# Altium integrated library LEMO Unipole And Multipole Type Connectors.IntLib: 1566 symbols (part 10 of 13)
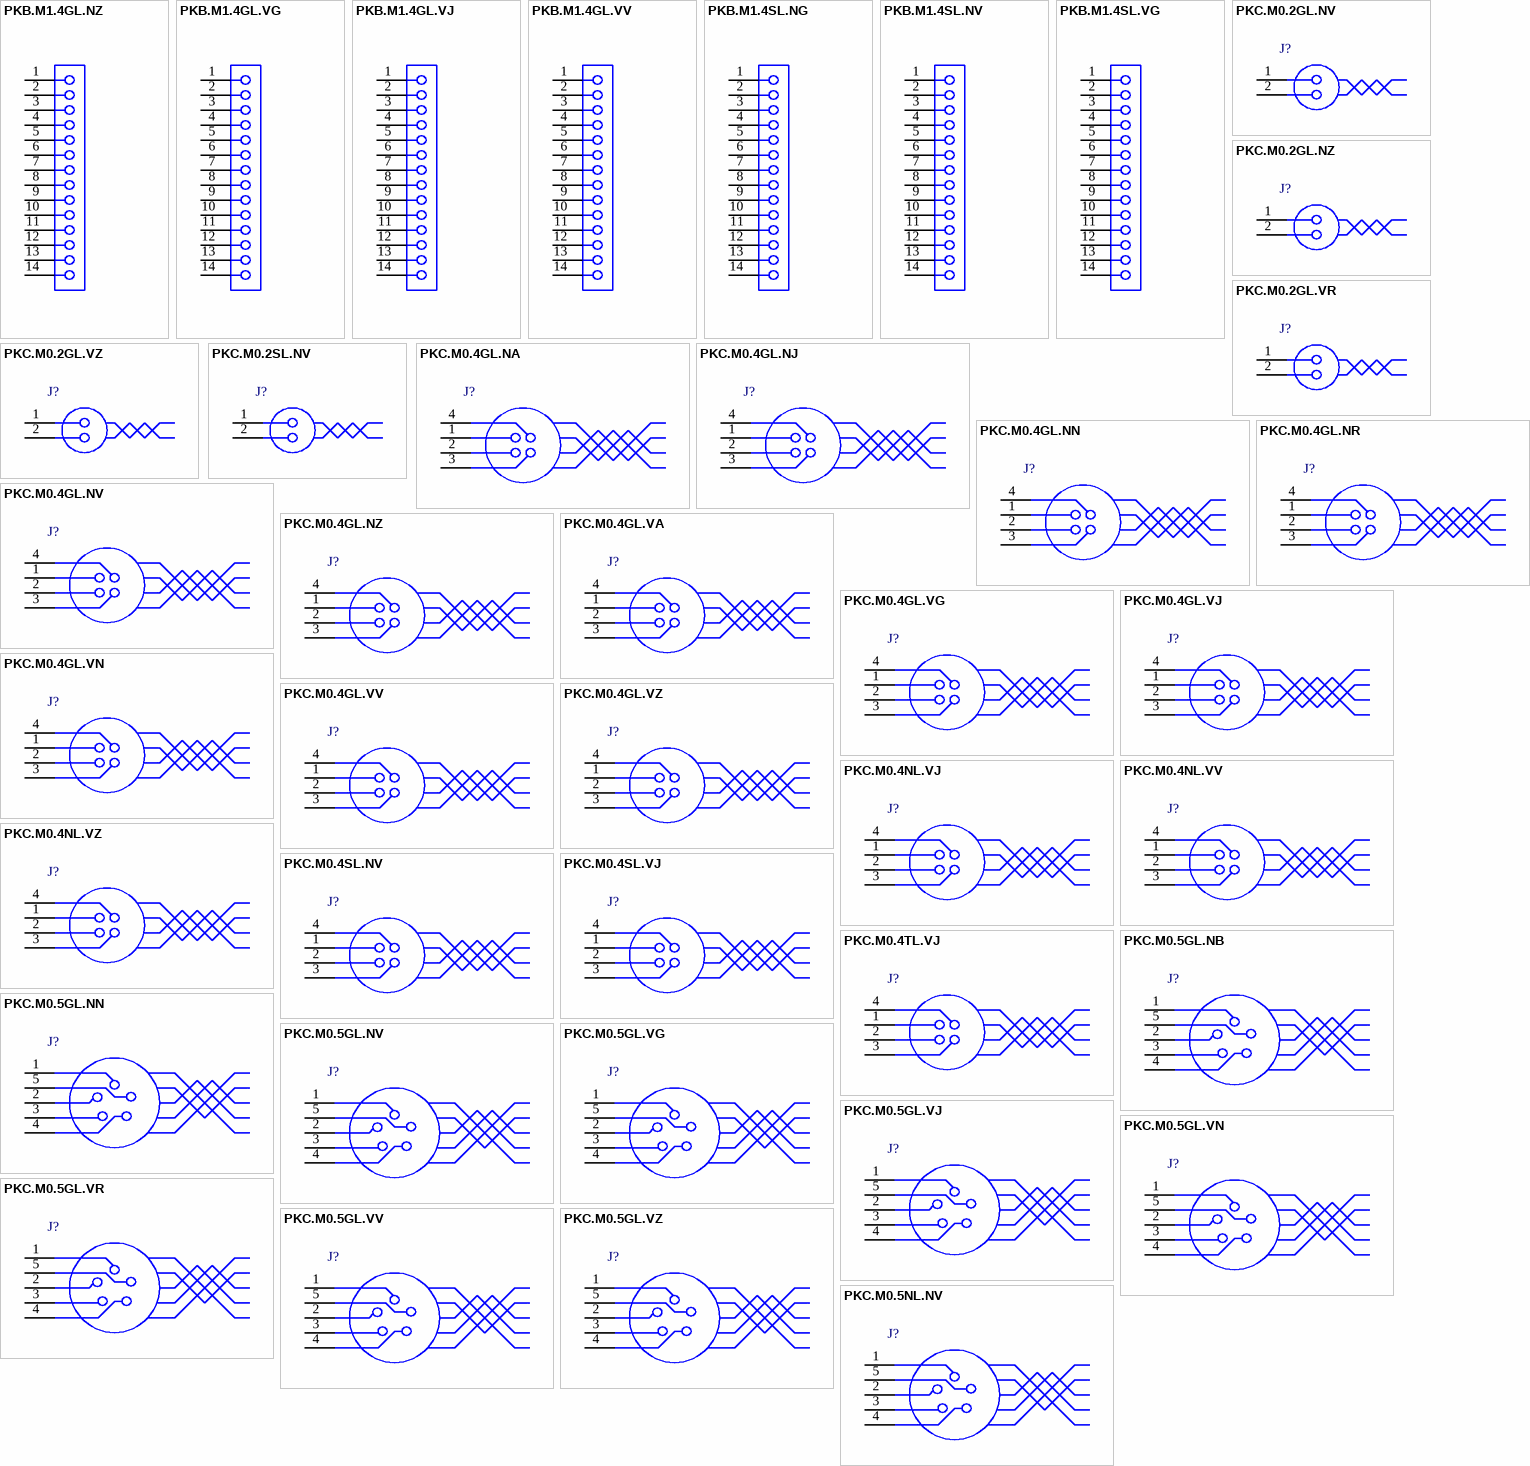
[diagram p52: symbols PKB.M1.4GL.NZ to PKC.M0.5NL.NV]

## PKC.M0.4SL.VJ
designator J?
Fixed receptacle with two nuts (back panel mounting), 90° print contacts, Key (C), P series, Multipole Type with 4 Contacts; Manufacturer: LEMO; PartNumber: PKC.M0.4SL.VJ; Number of contacts: 4; Contact Diameter: 0.9 mm; Test voltage (kV rms) Contact-Contact: 1.2; Rated Current(A): 8; DatasheetVersion: Jun-14; PackageReference: PKC.M0.4SL.VJ; PackageDescription: Fixed receptacle with two nuts (back panel mounting), 90° print contacts, Key(C) for Printed Circuit; Supplier 1: Mouser; Supplier Part Number 1: 736-PKCM04SLVJ; Supplier 2: Digi-Key; Supplier Part Number 2: PKC.M0.4SL.VJ-ND; ComponentLink1Description: Manufacturer URL; ComponentLink1URL: http://www.lemo.com; ComponentLink2Description: Datasheet; ComponentLink2URL: http://intra.lemo.ch/catalog/ROW/UK_English/P_series_catalog.pdf
footprint PKC.M0.4SL.VJ (Socket, Female, Height 33.5 mm, Through hole)
pins: 1, 2, 3, 4

## PKC.M0.4TL.VJ
designator J?
Fixed receptacle with two nuts (back panel mounting), 90° print contacts, Key (C), P series, Multipole Type with 4 Contacts; Manufacturer: LEMO; PartNumber: PKC.M0.4TL.VJ; Number of contacts: 4; Contact Diameter: 0.9 mm; Test voltage (kV rms) Contact-Contact: 1.2; Rated Current(A): 8; DatasheetVersion: Jun-14; PackageReference: PKC.M0.4TL.VJ; PackageDescription: Fixed receptacle with two nuts (back panel mounting), 90° print contacts, Key(C) for Printed Circuit; Supplier 1: Mouser; Supplier Part Number 1: 736-PKCM04TLVJ; Supplier 2: Digi-Key; Supplier Part Number 2: PKC.M0.4TL.VJ-ND; ComponentLink1Description: Manufacturer URL; ComponentLink1URL: http://www.lemo.com; ComponentLink2Description: Datasheet; ComponentLink2URL: http://intra.lemo.ch/catalog/ROW/UK_English/P_series_catalog.pdf
footprint PKC.M0.4TL.VJ (Socket, Female, Height 33.5 mm, Through hole)
pins: 1, 2, 3, 4

## PKC.M0.5GL.NB
designator J?
Fixed receptacle with two nuts (back panel mounting), straight print contacts, Key (C), P series, Multipole Type with 5 Contacts; Manufacturer: LEMO; PartNumber: PKC.M0.5GL.NB; Number of contacts: 5; Contact Diameter: 0.9 mm; Test voltage (kV rms) Contact-Contact: 1.05; Rated Current(A): 7; DatasheetVersion: Jun-14; PackageReference: PKC.M0.5GL.NB; PackageDescription: Fixed receptacle with two nuts (back panel mounting), straight print contacts, Key(C) for Printed Circuit; ComponentLink1Description: Manufacturer URL; ComponentLink1URL: http://www.lemo.com; ComponentLink2Description: Datasheet; ComponentLink2URL: http://intra.lemo.ch/catalog/ROW/UK_English/P_series_catalog.pdf
footprint PKC.M0.5GL.NB (Socket, Female, Height 33.5 mm, Through hole)
pins: 1, 2, 3, 4, 5

## PKC.M0.5GL.NN
designator J?
Fixed receptacle with two nuts (back panel mounting), straight print contacts, Key (C), P series, Multipole Type with 5 Contacts; Manufacturer: LEMO; PartNumber: PKC.M0.5GL.NN; Number of contacts: 5; Contact Diameter: 0.9 mm; Test voltage (kV rms) Contact-Contact: 1.05; Rated Current(A): 7; DatasheetVersion: Jun-14; PackageReference: PKC.M0.5GL.NN; PackageDescription: Fixed receptacle with two nuts (back panel mounting), straight print contacts, Key(C) for Printed Circuit; ComponentLink1Description: Manufacturer URL; ComponentLink1URL: http://www.lemo.com; ComponentLink2Description: Datasheet; ComponentLink2URL: http://intra.lemo.ch/catalog/ROW/UK_English/P_series_catalog.pdf
footprint PKC.M0.5GL.NN (Socket, Female, Height 33.5 mm, Through hole)
pins: 1, 2, 3, 4, 5

## PKC.M0.5GL.NV
designator J?
Fixed receptacle with two nuts (back panel mounting), straight print contacts, Key (C), P series, Multipole Type with 5 Contacts; Manufacturer: LEMO; PartNumber: PKC.M0.5GL.NV; Number of contacts: 5; Contact Diameter: 0.9 mm; Test voltage (kV rms) Contact-Contact: 1.05; Rated Current(A): 7; DatasheetVersion: Jun-14; PackageReference: PKC.M0.5GL.NV; PackageDescription: Fixed receptacle with two nuts (back panel mounting), straight print contacts, Key(C) for Printed Circuit; ComponentLink1Description: Manufacturer URL; ComponentLink1URL: http://www.lemo.com; ComponentLink2Description: Datasheet; ComponentLink2URL: http://intra.lemo.ch/catalog/ROW/UK_English/P_series_catalog.pdf
footprint PKC.M0.5GL.NV (Socket, Female, Height 33.5 mm, Through hole)
pins: 1, 2, 3, 4, 5

## PKC.M0.5GL.VG
designator J?
Fixed receptacle with two nuts (back panel mounting), 90° print contacts, Key (C), P series, Multipole Type with 5 Contacts; Manufacturer: LEMO; PartNumber: PKC.M0.5GL.VG; Number of contacts: 5; Contact Diameter: 0.9 mm; Test voltage (kV rms) Contact-Contact: 1.05; Rated Current(A): 7; DatasheetVersion: Jun-14; PackageReference: PKC.M0.5GL.VG; PackageDescription: Fixed receptacle with two nuts (back panel mounting), 90° print contacts, Key(C) for Printed Circuit; ComponentLink1Description: Manufacturer URL; ComponentLink1URL: http://www.lemo.com; ComponentLink2Description: Datasheet; ComponentLink2URL: http://intra.lemo.ch/catalog/ROW/UK_English/P_series_catalog.pdf
footprint PKC.M0.5GL.VG (Socket, Female, Height 33.5 mm, Through hole)
pins: 1, 2, 3, 4, 5

## PKC.M0.5GL.VJ
designator J?
Fixed receptacle with two nuts (back panel mounting), 90° print contacts, Key (C), P series, Multipole Type with 5 Contacts; Manufacturer: LEMO; PartNumber: PKC.M0.5GL.VJ; Number of contacts: 5; Contact Diameter: 0.9 mm; Test voltage (kV rms) Contact-Contact: 1.05; Rated Current(A): 7; DatasheetVersion: Jun-14; PackageReference: PKC.M0.5GL.VJ; PackageDescription: Fixed receptacle with two nuts (back panel mounting), 90° print contacts, Key(C) for Printed Circuit; ComponentLink1Description: Manufacturer URL; ComponentLink1URL: http://www.lemo.com; ComponentLink2Description: Datasheet; ComponentLink2URL: http://intra.lemo.ch/catalog/ROW/UK_English/P_series_catalog.pdf
footprint PKC.M0.5GL.VJ (Socket, Female, Height 33.5 mm, Through hole)
pins: 1, 2, 3, 4, 5

## PKC.M0.5GL.VN
designator J?
Fixed receptacle with two nuts (back panel mounting), 90° print contacts, Key (C), P series, Multipole Type with 5 Contacts; Manufacturer: LEMO; PartNumber: PKC.M0.5GL.VN; Number of contacts: 5; Contact Diameter: 0.9 mm; Test voltage (kV rms) Contact-Contact: 1.05; Rated Current(A): 7; DatasheetVersion: Jun-14; PackageReference: PKC.M0.5GL.VN; PackageDescription: Fixed receptacle with two nuts (back panel mounting), 90° print contacts, Key(C) for Printed Circuit; ComponentLink1Description: Manufacturer URL; ComponentLink1URL: http://www.lemo.com; ComponentLink2Description: Datasheet; ComponentLink2URL: http://intra.lemo.ch/catalog/ROW/UK_English/P_series_catalog.pdf
footprint PKC.M0.5GL.VN (Socket, Female, Height 33.5 mm, Through hole)
pins: 1, 2, 3, 4, 5

## PKC.M0.5GL.VR
designator J?
Fixed receptacle with two nuts (back panel mounting), 90° print contacts, Key (C),  series, Multipole Type with 5 Contacts; Manufacturer: LEMO; PartNumber: PKC.M0.5GL.VR; Number of contacts: 5; Contact Diameter: 0.9 mm; Test voltage (kV rms) Contact-Contact: 1.05; Rated Current(A): 7; DatasheetVersion: Jun-14; PackageReference: PKC.M0.5GL.VR; PackageDescription: Fixed receptacle with two nuts (back panel mounting), 90° print contacts, Key(C) for Printed Circuit; ComponentLink1Description: Manufacturer URL; ComponentLink1URL: http://www.lemo.com; ComponentLink2Description: Datasheet; ComponentLink2URL: http://intra.lemo.ch/catalog/ROW/UK_English/P_series_catalog.pdf
footprint PKC.M0.5GL.VR (Socket, Female, Height 33.5 mm, Through hole)
pins: 1, 2, 3, 4, 5

## PKC.M0.5GL.VV
designator J?
Fixed receptacle with two nuts (back panel mounting), 90° print contacts, Key (C), P series, Multipole Type with 5 Contacts; Manufacturer: LEMO; PartNumber: PKC.M0.5GL.VV; Number of contacts: 5; Contact Diameter: 0.9 mm; Test voltage (kV rms) Contact-Contact: 1.05; Rated Current(A): 7; DatasheetVersion: Jun-14; PackageReference: PKC.M0.5GL.VV; PackageDescription: Fixed receptacle with two nuts (back panel mounting), 90° print contacts, Key(C) for Printed Circuit; ComponentLink1Description: Manufacturer URL; ComponentLink1URL: http://www.lemo.com; ComponentLink2Description: Datasheet; ComponentLink2URL: http://intra.lemo.ch/catalog/ROW/UK_English/P_series_catalog.pdf
footprint PKC.M0.5GL.VV (Socket, Female, Height 33.5 mm, Through hole)
pins: 1, 2, 3, 4, 5

## PKC.M0.5GL.VZ
designator J?
Fixed receptacle with 1 nut (without 2nd front nut), Key (C), P series, Multipole Type with 5 Contacts; Manufacturer: LEMO; PartNumber: PKC.M0.5GL.VZ; Number of contacts: 5; Contact Diameter: 0.9 mm; Test voltage (kV rms) Contact-Contact: 1.05; Rated Current(A): 7; DatasheetVersion: Jun-14; PackageReference: PKC.M0.5GL.VZ; PackageDescription: Fixed receptacle with 1 nut (without 2nd front nut), Key(C) for Printed Circuit; ComponentLink1Description: Manufacturer URL; ComponentLink1URL: http://www.lemo.com; ComponentLink2Description: Datasheet; ComponentLink2URL: http://intra.lemo.ch/catalog/ROW/UK_English/P_series_catalog.pdf
footprint PKC.M0.5GL.VZ (Socket, Female, Height 33.5 mm, Through hole)
pins: 1, 2, 3, 4, 5

## PKC.M0.5NL.NV
designator J?
Fixed receptacle with two nuts (back panel mounting), straight print contacts, Key (C), P series, Multipole Type with 5 Contacts; Manufacturer: LEMO; PartNumber: PKC.M0.5NL.NV; Number of contacts: 5; Contact Diameter: 0.9 mm; Test voltage (kV rms) Contact-Contact: 1.05; Rated Current(A): 7; DatasheetVersion: Jun-14; PackageReference: PKC.M0.5NL.NV; PackageDescription: Fixed receptacle with two nuts (back panel mounting), straight print contacts, Key(C) for Printed Circuit; ComponentLink1Description: Manufacturer URL; ComponentLink1URL: http://www.lemo.com; ComponentLink2Description: Datasheet; ComponentLink2URL: http://intra.lemo.ch/catalog/ROW/UK_English/P_series_catalog.pdf
footprint PKC.M0.5NL.NV (Socket, Female, Height 33.5 mm, Through hole)
pins: 1, 2, 3, 4, 5

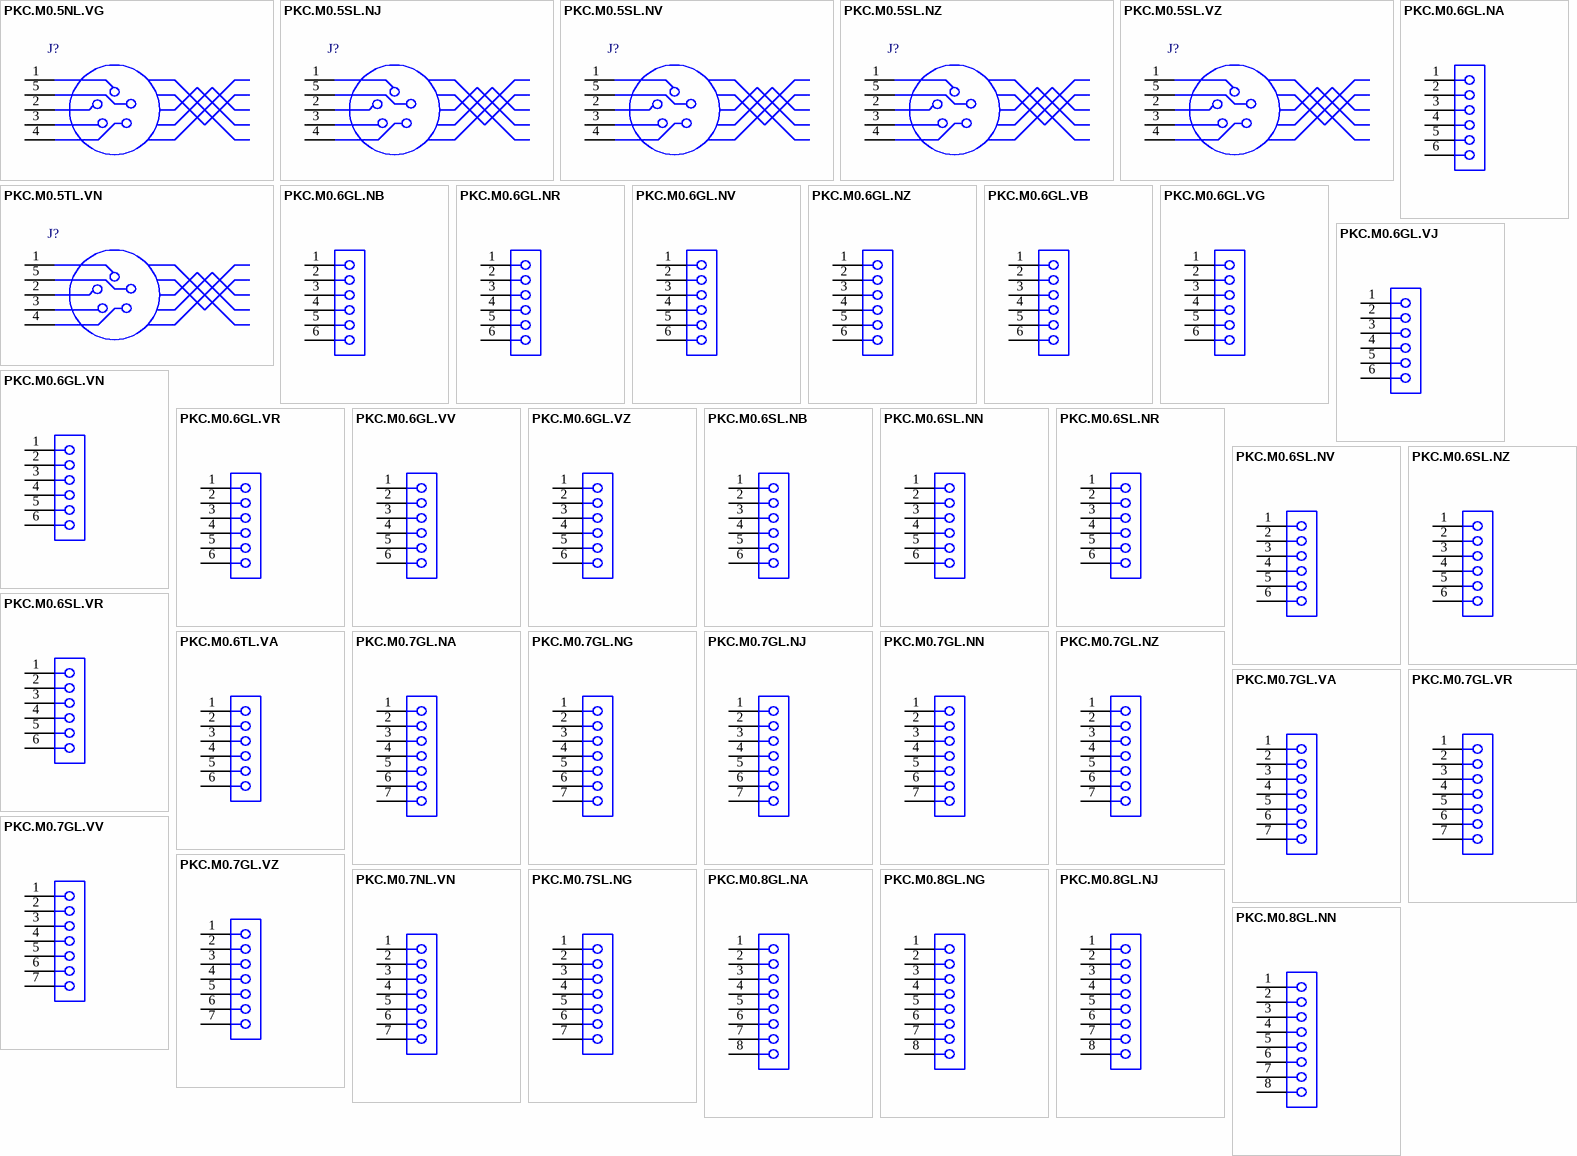
[diagram p31: symbols PKC.M0.5NL.VG to PKC.M0.8GL.NN]

## PKC.M0.5NL.VG
designator J?
Fixed receptacle with two nuts (back panel mounting), 90° print contacts, Key (C), P series, Multipole Type with 5 Contacts; Manufacturer: LEMO; PartNumber: PKC.M0.5NL.VG; Number of contacts: 5; Contact Diameter: 0.9 mm; Test voltage (kV rms) Contact-Contact: 1.05; Rated Current(A): 7; DatasheetVersion: Jun-14; PackageReference: PKC.M0.5NL.VG; PackageDescription: Fixed receptacle with two nuts (back panel mounting), 90° print contacts, Key(C) for Printed Circuit; ComponentLink1Description: Manufacturer URL; ComponentLink1URL: http://www.lemo.com; ComponentLink2Description: Datasheet; ComponentLink2URL: http://intra.lemo.ch/catalog/ROW/UK_English/P_series_catalog.pdf
footprint PKC.M0.5NL.VG (Socket, Female, Height 33.5 mm, Through hole)
pins: 1, 2, 3, 4, 5

## PKC.M0.5SL.NJ
designator J?
Fixed receptacle with two nuts (back panel mounting), straight print contacts, Key (C),  series, Multipole Type with 5 Contacts; Manufacturer: LEMO; PartNumber: PKC.M0.5SL.NJ; Number of contacts: 5; Contact Diameter: 0.9 mm; Test voltage (kV rms) Contact-Contact: 1.05; Rated Current(A): 7; DatasheetVersion: Jun-14; PackageReference: PKC.M0.5SL.NJ; PackageDescription: Fixed receptacle with two nuts (back panel mounting), straight print contacts, Key(C) for Printed Circuit; Supplier 1: Mouser; Supplier Part Number 1: 736-PKCM05SLNJ; Supplier 2: Digi-Key; Supplier Part Number 2: PKC.M0.5SL.NJ-ND; ComponentLink1Description: Manufacturer URL; ComponentLink1URL: http://www.lemo.com; ComponentLink2Description: Datasheet; ComponentLink2URL: http://intra.lemo.ch/catalog/ROW/UK_English/P_series_catalog.pdf
footprint PKC.M0.5SL.NJ (Socket, Female, Height 33.5 mm, Through hole)
pins: 1, 2, 3, 4, 5

## PKC.M0.5SL.NV
designator J?
Fixed receptacle with two nuts (back panel mounting), straight print contacts, Key (C), P series, Multipole Type with 5 Contacts; Manufacturer: LEMO; PartNumber: PKC.M0.5SL.NV; Number of contacts: 5; Contact Diameter: 0.9 mm; Test voltage (kV rms) Contact-Contact: 1.05; Rated Current(A): 7; DatasheetVersion: Jun-14; PackageReference: PKC.M0.5SL.NV; PackageDescription: Fixed receptacle with two nuts (back panel mounting), straight print contacts, Key(C) for Printed Circuit; ComponentLink1Description: Manufacturer URL; ComponentLink1URL: http://www.lemo.com; ComponentLink2Description: Datasheet; ComponentLink2URL: http://intra.lemo.ch/catalog/ROW/UK_English/P_series_catalog.pdf
footprint PKC.M0.5SL.NV (Socket, Female, Height 33.5 mm, Through hole)
pins: 1, 2, 3, 4, 5

## PKC.M0.5SL.NZ
designator J?
Fixed receptacle with 1 nut (without 2nd front nut), Key (C), P series, Multipole Type with 5 Contacts; Manufacturer: LEMO; PartNumber: PKC.M0.5SL.NZ; Number of contacts: 5; Contact Diameter: 0.9 mm; Test voltage (kV rms) Contact-Contact: 1.05; Rated Current(A): 7; DatasheetVersion: Jun-14; PackageReference: PKC.M0.5SL.NZ; PackageDescription: Fixed receptacle with 1 nut (without 2nd front nut), Key(C) for Printed Circuit; Supplier 1: Mouser; Supplier Part Number 1: 736-PKCM05SLNZ; Supplier 2: Digi-Key; Supplier Part Number 2: PKC.M0.5SL.NZ-ND; ComponentLink1Description: Manufacturer URL; ComponentLink1URL: http://www.lemo.com; ComponentLink2Description: Datasheet; ComponentLink2URL: http://intra.lemo.ch/catalog/ROW/UK_English/P_series_catalog.pdf
footprint PKC.M0.5SL.NZ (Socket, Female, Height 25 mm, Through hole)
pins: 1, 2, 3, 4, 5

## PKC.M0.5SL.VZ
designator J?
Fixed receptacle with 1 nut (without 2nd front nut), Key (C), P series, Multipole Type with 5 Contacts; Manufacturer: LEMO; PartNumber: PKC.M0.5SL.VZ; Number of contacts: 5; Contact Diameter: 0.9 mm; Test voltage (kV rms) Contact-Contact: 1.05; Rated Current(A): 7; DatasheetVersion: Jun-14; PackageReference: PKC.M0.5SL.VZ; PackageDescription: Fixed receptacle with 1 nut (without 2nd front nut), Key(C) for Printed Circuit; Supplier 1: Mouser; Supplier Part Number 1: 736-PKCM05SLVZ; Supplier 2: Digi-Key; Supplier Part Number 2: PKC.M0.5SL.VZ-ND; ComponentLink1Description: Manufacturer URL; ComponentLink1URL: http://www.lemo.com; ComponentLink2Description: Datasheet; ComponentLink2URL: http://intra.lemo.ch/catalog/ROW/UK_English/P_series_catalog.pdf
footprint PKC.M0.5SL.VZ (Socket, Female, Height 33.5 mm, Through hole)
pins: 1, 2, 3, 4, 5

## PKC.M0.5TL.VN
designator J?
Fixed receptacle with two nuts (back panel mounting), 90° print contacts, Key (C), P series, Multipole Type with 5 Contacts; Manufacturer: LEMO; PartNumber: PKC.M0.5TL.VN; Number of contacts: 5; Contact Diameter: 0.9 mm; Test voltage (kV rms) Contact-Contact: 1.05; Rated Current(A): 7; DatasheetVersion: Jun-14; PackageReference: PKC.M0.5TL.VN; PackageDescription: Fixed receptacle with two nuts (back panel mounting), 90° print contacts, Key(C) for Printed Circuit; Supplier 1: Mouser; Supplier Part Number 1: 736-PKCM05TLVN; Supplier 2: Digi-Key; Supplier Part Number 2: PKC.M0.5TL.VN-ND; ComponentLink1Description: Manufacturer URL; ComponentLink1URL: http://www.lemo.com; ComponentLink2Description: Datasheet; ComponentLink2URL: http://intra.lemo.ch/catalog/ROW/UK_English/P_series_catalog.pdf
footprint PKC.M0.5TL.VN (Socket, Female, Height 33.5 mm, Through hole)
pins: 1, 2, 3, 4, 5

## PKC.M0.6GL.NA
designator J?
Fixed receptacle with two nuts (back panel mounting), straight print contacts, Key (C), P series, Multipole Type with 6 Contacts; Manufacturer: LEMO; PartNumber: PKC.M0.6GL.NA; Number of contacts: 6; Contact Diameter: 0.7 mm; Test voltage (kV rms) Contact-Contact: 1.05; DatasheetVersion: Jun-14; PackageReference: PKC.M0.6GL.NA; PackageDescription: Fixed receptacle with two nuts (back panel mounting), straight print contacts, Key(C) for Printed Circuit; Rated Current(A): 6; ComponentLink1Description: Manufacturer URL; ComponentLink1URL: http://www.lemo.com; ComponentLink2Description: Datasheet; ComponentLink2URL: http://intra.lemo.ch/catalog/ROW/UK_English/P_series_catalog.pdf
footprint PKC.M0.6GL.NA (Socket, Female, Height 33.5 mm, Through hole)
pins: 1, 2, 3, 4, 5, 6

## PKC.M0.6GL.NB
designator J?
Fixed receptacle with two nuts (back panel mounting), straight print contacts, Key (C), P series, Multipole Type with 6 Contacts; Manufacturer: LEMO; PartNumber: PKC.M0.6GL.NB; Number of contacts: 6; Contact Diameter: 0.7 mm; Test voltage (kV rms) Contact-Contact: 1.05; DatasheetVersion: Jun-14; PackageReference: PKC.M0.6GL.NB; PackageDescription: Fixed receptacle with two nuts (back panel mounting), straight print contacts, Key(C) for Printed Circuit; Rated Current(A): 6; ComponentLink1Description: Manufacturer URL; ComponentLink1URL: http://www.lemo.com; ComponentLink2Description: Datasheet; ComponentLink2URL: http://intra.lemo.ch/catalog/ROW/UK_English/P_series_catalog.pdf
footprint PKC.M0.6GL.NB (Socket, Female, Height 33.5 mm, Through hole)
pins: 1, 2, 3, 4, 5, 6

## PKC.M0.6GL.NR
designator J?
Fixed receptacle with two nuts (back panel mounting), straight print contacts, Key (C), P series, Multipole Type with 6 Contacts; Manufacturer: LEMO; PartNumber: PKC.M0.6GL.NR; Number of contacts: 6; Contact Diameter: 0.7 mm; Test voltage (kV rms) Contact-Contact: 1.05; DatasheetVersion: Jun-14; PackageReference: PKC.M0.6GL.NR; PackageDescription: Fixed receptacle with two nuts (back panel mounting), straight print contacts, Key(C) for Printed Circuit; Rated Current(A): 6; ComponentLink1Description: Manufacturer URL; ComponentLink1URL: http://www.lemo.com; ComponentLink2Description: Datasheet; ComponentLink2URL: http://intra.lemo.ch/catalog/ROW/UK_English/P_series_catalog.pdf
footprint PKC.M0.6GL.NR (Socket, Female, Height 33.5 mm, Through hole)
pins: 1, 2, 3, 4, 5, 6

## PKC.M0.6GL.NV
designator J?
Fixed receptacle with two nuts (back panel mounting), straight print contacts, Key (C), P series, Multipole Type with 6 Contacts; Manufacturer: LEMO; PartNumber: PKC.M0.6GL.NV; Number of contacts: 6; Contact Diameter: 0.7 mm; Test voltage (kV rms) Contact-Contact: 1.05; DatasheetVersion: Jun-14; PackageReference: PKC.M0.6GL.NV; PackageDescription: Fixed receptacle with two nuts (back panel mounting), straight print contacts, Key(C) for Printed Circuit; Rated Current(A): 6; ComponentLink1Description: Manufacturer URL; ComponentLink1URL: http://www.lemo.com; ComponentLink2Description: Datasheet; ComponentLink2URL: http://intra.lemo.ch/catalog/ROW/UK_English/P_series_catalog.pdf
footprint PKC.M0.6GL.NV (Socket, Female, Height 33.5 mm, Through hole)
pins: 1, 2, 3, 4, 5, 6

## PKC.M0.6GL.NZ
designator J?
Fixed receptacle with 1 nut (without 2nd front nut), Key (C), P series, Multipole Type with 6 Contacts; Manufacturer: LEMO; PartNumber: PKC.M0.6GL.NZ; Number of contacts: 6; Contact Diameter: 0.7 mm; Test voltage (kV rms) Contact-Contact: 1.05; DatasheetVersion: Jun-14; PackageReference: PKC.M0.6GL.NZ; PackageDescription: Fixed receptacle with 1 nut (without 2nd front nut), Key(C) for Printed Circuit; Rated Current(A): 6; ComponentLink1Description: Manufacturer URL; ComponentLink1URL: http://www.lemo.com; ComponentLink2Description: Datasheet; ComponentLink2URL: http://intra.lemo.ch/catalog/ROW/UK_English/P_series_catalog.pdf
footprint PKC.M0.6GL.NZ (Socket, Female, Height 25 mm, Through hole)
pins: 1, 2, 3, 4, 5, 6

## PKC.M0.6GL.VB
designator J?
Fixed receptacle with two nuts (back panel mounting), 90° print contacts, Key (C), P series, Multipole Type with 6 Contacts; Manufacturer: LEMO; PartNumber: PKC.M0.6GL.VB; Number of contacts: 6; Contact Diameter: 0.7 mm; Test voltage (kV rms) Contact-Contact: 1.05; DatasheetVersion: Jun-14; PackageReference: PKC.M0.6GL.VB; PackageDescription: Fixed receptacle with two nuts (back panel mounting), 90° print contacts, Key(C) for Printed Circuit; Rated Current(A): 6; ComponentLink1Description: Manufacturer URL; ComponentLink1URL: http://www.lemo.com; ComponentLink2Description: Datasheet; ComponentLink2URL: http://intra.lemo.ch/catalog/ROW/UK_English/P_series_catalog.pdf
footprint PKC.M0.6GL.VB (Socket, Female, Height 33.5 mm, Through hole)
pins: 1, 2, 3, 4, 5, 6

## PKC.M0.6GL.VG
designator J?
Fixed receptacle with two nuts (back panel mounting), 90° print contacts, Key (C), P series, Multipole Type with 6 Contacts; Manufacturer: LEMO; PartNumber: PKC.M0.6GL.VG; Number of contacts: 6; Contact Diameter: 0.7 mm; Test voltage (kV rms) Contact-Contact: 1.05; DatasheetVersion: Jun-14; PackageReference: PKC.M0.6GL.VG; PackageDescription: Fixed receptacle with two nuts (back panel mounting), 90° print contacts, Key(C) for Printed Circuit; Rated Current(A): 6; ComponentLink1Description: Manufacturer URL; ComponentLink1URL: http://www.lemo.com; ComponentLink2Description: Datasheet; ComponentLink2URL: http://intra.lemo.ch/catalog/ROW/UK_English/P_series_catalog.pdf
footprint PKC.M0.6GL.VG (Socket, Female, Height 33.5 mm, Through hole)
pins: 1, 2, 3, 4, 5, 6

## PKC.M0.6GL.VJ
designator J?
Fixed receptacle with two nuts (back panel mounting), 90° print contacts, Key (C), P series, Multipole Type with 6 Contacts; Manufacturer: LEMO; PartNumber: PKC.M0.6GL.VJ; Number of contacts: 6; Contact Diameter: 0.7 mm; Test voltage (kV rms) Contact-Contact: 1.05; DatasheetVersion: Jun-14; PackageReference: PKC.M0.6GL.VJ; PackageDescription: Fixed receptacle with two nuts (back panel mounting), 90° print contacts, Key(C) for Printed Circuit; Rated Current(A): 6; ComponentLink1Description: Manufacturer URL; ComponentLink1URL: http://www.lemo.com; ComponentLink2Description: Datasheet; ComponentLink2URL: http://intra.lemo.ch/catalog/ROW/UK_English/P_series_catalog.pdf
footprint PKC.M0.6GL.VJ (Socket, Female, Height 33.5 mm, Through hole)
pins: 1, 2, 3, 4, 5, 6

## PKC.M0.6GL.VN
designator J?
Fixed receptacle with two nuts (back panel mounting), 90° print contacts, Key (C), P series, Multipole Type with 6 Contacts; Manufacturer: LEMO; PartNumber: PKC.M0.6GL.VN; Number of contacts: 6; Contact Diameter: 0.7 mm; Test voltage (kV rms) Contact-Contact: 1.05; DatasheetVersion: Jun-14; PackageReference: PKC.M0.6GL.VN; PackageDescription: Fixed receptacle with two nuts (back panel mounting), 90° print contacts, Key(C) for Printed Circuit; Rated Current(A): 6; ComponentLink1Description: Manufacturer URL; ComponentLink1URL: http://www.lemo.com; ComponentLink2Description: Datasheet; ComponentLink2URL: http://intra.lemo.ch/catalog/ROW/UK_English/P_series_catalog.pdf
footprint PKC.M0.6GL.VN (Socket, Female, Height 33.5 mm, Through hole)
pins: 1, 2, 3, 4, 5, 6

## PKC.M0.6GL.VR
designator J?
Fixed receptacle with two nuts (back panel mounting), 90° print contacts, Key (C), P series, Multipole Type with 6 Contacts; Manufacturer: LEMO; PartNumber: PKC.M0.6GL.VR; Number of contacts: 6; Contact Diameter: 0.7 mm; Test voltage (kV rms) Contact-Contact: 1.05; DatasheetVersion: Jun-14; PackageReference: PKC.M0.6GL.VR; PackageDescription: Fixed receptacle with two nuts (back panel mounting), 90° print contacts, Key(C) for Printed Circuit; Rated Current(A): 6; ComponentLink1Description: Manufacturer URL; ComponentLink1URL: http://www.lemo.com; ComponentLink2Description: Datasheet; ComponentLink2URL: http://intra.lemo.ch/catalog/ROW/UK_English/P_series_catalog.pdf
footprint PKC.M0.6GL.VR (Socket, Female, Height 33.5 mm, Through hole)
pins: 1, 2, 3, 4, 5, 6

## PKC.M0.6GL.VV
designator J?
Fixed receptacle with two nuts (back panel mounting), 90° print contacts, Key (C), P series, Multipole Type with 6 Contacts; Manufacturer: LEMO; PartNumber: PKC.M0.6GL.VV; Number of contacts: 6; Contact Diameter: 0.7 mm; Test voltage (kV rms) Contact-Contact: 1.05; DatasheetVersion: Jun-14; PackageReference: PKC.M0.6GL.VV; PackageDescription: Fixed receptacle with two nuts (back panel mounting), 90° print contacts, Key(C) for Printed Circuit; Rated Current(A): 6; ComponentLink1Description: Manufacturer URL; ComponentLink1URL: http://www.lemo.com; ComponentLink2Description: Datasheet; ComponentLink2URL: http://intra.lemo.ch/catalog/ROW/UK_English/P_series_catalog.pdf
footprint PKC.M0.6GL.VV (Socket, Female, Height 33.5 mm, Through hole)
pins: 1, 2, 3, 4, 5, 6

## PKC.M0.6GL.VZ
designator J?
Fixed receptacle with 1 nut (without 2nd front nut), Key (C), P series, Multipole Type with 6 Contacts; Manufacturer: LEMO; PartNumber: PKC.M0.6GL.VZ; Number of contacts: 6; Contact Diameter: 0.7 mm; Test voltage (kV rms) Contact-Contact: 1.05; DatasheetVersion: Jun-14; PackageReference: PKC.M0.6GL.VZ; PackageDescription: Fixed receptacle with 1 nut (without 2nd front nut), Key(C) for Printed Circuit; Rated Current(A): 6; ComponentLink1Description: Manufacturer URL; ComponentLink1URL: http://www.lemo.com; ComponentLink2Description: Datasheet; ComponentLink2URL: http://intra.lemo.ch/catalog/ROW/UK_English/P_series_catalog.pdf
footprint PKC.M0.6GL.VZ (Socket, Female, Height 33.5 mm, Through hole)
pins: 1, 2, 3, 4, 5, 6

## PKC.M0.6SL.NB
designator J?
Fixed receptacle with two nuts (back panel mounting), straight print contacts, Key (C), P series, Multipole Type with 6 Contacts; Manufacturer: LEMO; PartNumber: PKC.M0.6SL.NB; Number of contacts: 6; Contact Diameter: 0.7 mm; Test voltage (kV rms) Contact-Contact: 1.05; DatasheetVersion: Jun-14; PackageReference: PKC.M0.6SL.NB; PackageDescription: Fixed receptacle with two nuts (back panel mounting), straight print contacts, Key(C) for Printed Circuit; Supplier 1: Mouser; Supplier Part Number 1: 736-PKCM06SLNB; Supplier 2: Digi-Key; Supplier Part Number 2: PKC.M0.6SL.NB-ND; Rated Current(A): 6; ComponentLink1Description: Manufacturer URL; ComponentLink1URL: http://www.lemo.com; ComponentLink2Description: Datasheet; ComponentLink2URL: http://intra.lemo.ch/catalog/ROW/UK_English/P_series_catalog.pdf
footprint PKC.M0.6SL.NB (Socket, Female, Height 33.5 mm, Through hole)
pins: 1, 2, 3, 4, 5, 6

## PKC.M0.6SL.NN
designator J?
Fixed receptacle with two nuts (back panel mounting), straight print contacts, Key (C),  series, Multipole Type with 6 Contacts; Manufacturer: LEMO; PartNumber: PKC.M0.6SL.NN; Number of contacts: 6; Contact Diameter: 0.7 mm; Test voltage (kV rms) Contact-Contact: 1.05; DatasheetVersion: Jun-14; PackageReference: PKC.M0.6SL.NN; PackageDescription: Fixed receptacle with two nuts (back panel mounting), straight print contacts, Key(C) for Printed Circuit; Supplier 1: Mouser; Supplier Part Number 1: 736-PKCM06SLNN; Supplier 2: Digi-Key; Supplier Part Number 2: PKC.M0.6SL.NN-ND; Rated Current(A): 6; ComponentLink1Description: Manufacturer URL; ComponentLink1URL: http://www.lemo.com; ComponentLink2Description: Datasheet; ComponentLink2URL: http://intra.lemo.ch/catalog/ROW/UK_English/P_series_catalog.pdf
footprint PKC.M0.6SL.NN (Socket, Female, Height 33.5 mm, Through hole)
pins: 1, 2, 3, 4, 5, 6

## PKC.M0.6SL.NR
designator J?
Fixed receptacle with two nuts (back panel mounting), straight print contacts, Key (C), P series, Multipole Type with 6 Contacts; Manufacturer: LEMO; PartNumber: PKC.M0.6SL.NR; Number of contacts: 6; Contact Diameter: 0.7 mm; Test voltage (kV rms) Contact-Contact: 1.05; DatasheetVersion: Jun-14; PackageReference: PKC.M0.6SL.NR; PackageDescription: Fixed receptacle with two nuts (back panel mounting), straight print contacts, Key(C) for Printed Circuit; Rated Current(A): 6; ComponentLink1Description: Manufacturer URL; ComponentLink1URL: http://www.lemo.com; ComponentLink2Description: Datasheet; ComponentLink2URL: http://intra.lemo.ch/catalog/ROW/UK_English/P_series_catalog.pdf
footprint PKC.M0.6SL.NR (Socket, Female, Height 33.5 mm, Through hole)
pins: 1, 2, 3, 4, 5, 6

## PKC.M0.6SL.NV
designator J?
Fixed receptacle with two nuts (back panel mounting), straight print contacts, Key (C), P series, Multipole Type with 6 Contacts; Manufacturer: LEMO; PartNumber: PKC.M0.6SL.NV; Number of contacts: 6; Contact Diameter: 0.7 mm; Test voltage (kV rms) Contact-Contact: 1.05; DatasheetVersion: Jun-14; PackageReference: PKC.M0.6SL.NV; PackageDescription: Fixed receptacle with two nuts (back panel mounting), straight print contacts, Key(C) for Printed Circuit; Rated Current(A): 6; ComponentLink1Description: Manufacturer URL; ComponentLink1URL: http://www.lemo.com; ComponentLink2Description: Datasheet; ComponentLink2URL: http://intra.lemo.ch/catalog/ROW/UK_English/P_series_catalog.pdf
footprint PKC.M0.6SL.NV (Socket, Female, Height 33.5 mm, Through hole)
pins: 1, 2, 3, 4, 5, 6

## PKC.M0.6SL.NZ
designator J?
Fixed receptacle with 1 nut (without 2nd front nut), Key (C), P series, Multipole Type with 6 Contacts; Manufacturer: LEMO; PartNumber: PKC.M0.6SL.NZ; Number of contacts: 6; Contact Diameter: 0.7 mm; Test voltage (kV rms) Contact-Contact: 1.05; DatasheetVersion: Jun-14; PackageReference: PKC.M0.6SL.NZ; PackageDescription: Fixed receptacle with 1 nut (without 2nd front nut), Key(C) for Printed Circuit; Supplier 1: Mouser; Supplier Part Number 1: 736-PKCM06SLNZ; Supplier 2: Digi-Key; Supplier Part Number 2: PKC.M0.6SL.NZ-ND; Rated Current(A): 6; ComponentLink1Description: Manufacturer URL; ComponentLink1URL: http://www.lemo.com; ComponentLink2Description: Datasheet; ComponentLink2URL: http://intra.lemo.ch/catalog/ROW/UK_English/P_series_catalog.pdf
footprint PKC.M0.6SL.NZ (Socket, Female, Height 25 mm, Through hole)
pins: 1, 2, 3, 4, 5, 6

## PKC.M0.6SL.VR
designator J?
Fixed receptacle with two nuts (back panel mounting), 90° print contacts, Key (C), P series, Multipole Type with 6 Contacts; Manufacturer: LEMO; PartNumber: PKC.M0.6SL.VR; Number of contacts: 6; Contact Diameter: 0.7 mm; Test voltage (kV rms) Contact-Contact: 1.05; DatasheetVersion: Jun-14; PackageReference: PKC.M0.6SL.VR; PackageDescription: Fixed receptacle with two nuts (back panel mounting), 90° print contacts, Key(C) for Printed Circuit; Supplier 1: Mouser; Supplier Part Number 1: 736-PKCM06SLVR; Supplier 2: Digi-Key; Supplier Part Number 2: PKC.M0.6SL.VR-ND; Rated Current(A): 6; ComponentLink1Description: Manufacturer URL; ComponentLink1URL: http://www.lemo.com; ComponentLink2Description: Datasheet; ComponentLink2URL: http://intra.lemo.ch/catalog/ROW/UK_English/P_series_catalog.pdf
footprint PKC.M0.6SL.VR (Socket, Female, Height 33.5 mm, Through hole)
pins: 1, 2, 3, 4, 5, 6

## PKC.M0.6TL.VA
designator J?
Fixed receptacle with two nuts (back panel mounting), 90° print contacts, Key (C), P series, Multipole Type with 6 Contacts; Manufacturer: LEMO; PartNumber: PKC.M0.6TL.VA; Number of contacts: 6; Contact Diameter: 0.7 mm; Test voltage (kV rms) Contact-Contact: 1.05; DatasheetVersion: Jun-14; PackageReference: PKC.M0.6TL.VA; PackageDescription: Fixed receptacle with two nuts (back panel mounting), 90° print contacts, Key(C) for Printed Circuit; Supplier 1: Mouser; Supplier Part Number 1: 736-PKC.M0.6TL.VA; Supplier 2: Digi-Key; Supplier Part Number 2: PKC.M0.6TL.VA-ND; Rated Current(A): 6; ComponentLink1Description: Manufacturer URL; ComponentLink1URL: http://www.lemo.com; ComponentLink2Description: Datasheet; ComponentLink2URL: http://intra.lemo.ch/catalog/ROW/UK_English/P_series_catalog.pdf
footprint PKC.M0.6TL.VA (Socket, Female, Through hole)
pins: 1, 2, 3, 4, 5, 6

## PKC.M0.7GL.NA
designator J?
Fixed receptacle with two nuts (back panel mounting), straight print contacts, Key (C), P series, Multipole Type with 7 Contacts; Manufacturer: LEMO; PartNumber: PKC.M0.7GL.NA; Number of contacts: 7; Contact Diameter: 0.7 mm; Test voltage (kV rms) Contact-Contact: 1.05; Rated Current(A): 5; DatasheetVersion: Jun-14; PackageReference: PKC.M0.7GL.NA; PackageDescription: Fixed receptacle with two nuts (back panel mounting), straight print contacts, Key(C) for Printed Circuit; ComponentLink1Description: Manufacturer URL; ComponentLink1URL: http://www.lemo.com; ComponentLink2Description: Datasheet; ComponentLink2URL: http://intra.lemo.ch/catalog/ROW/UK_English/P_series_catalog.pdf
footprint PKC.M0.7GL.NA (Socket, Female, Height 33.5 mm, Through hole)
pins: 1, 2, 3, 4, 5, 6, 7

## PKC.M0.7GL.NG
designator J?
Fixed receptacle with two nuts (back panel mounting), straight print contacts, Key (C), P series, Multipole Type with 7 Contacts; Manufacturer: LEMO; PartNumber: PKC.M0.7GL.NG; Number of contacts: 7; Contact Diameter: 0.7 mm; Test voltage (kV rms) Contact-Contact: 1.05; Rated Current(A): 5; DatasheetVersion: Jun-14; PackageReference: PKC.M0.7GL.NG; PackageDescription: Fixed receptacle with two nuts (back panel mounting), straight print contacts, Key(C) for Printed Circuit; Supplier 1: Mouser; Supplier Part Number 1: 736-PKCM07GLNG; Supplier 2: Digi-Key; Supplier Part Number 2: PKC.M0.7GL.NG-ND; ComponentLink1Description: Manufacturer URL; ComponentLink1URL: http://www.lemo.com; ComponentLink2Description: Datasheet; ComponentLink2URL: http://intra.lemo.ch/catalog/ROW/UK_English/P_series_catalog.pdf
footprint PKC.M0.7GL.NG (Socket, Female, Height 33.5 mm, Through hole)
pins: 1, 2, 3, 4, 5, 6, 7

## PKC.M0.7GL.NJ
designator J?
Fixed receptacle with two nuts (back panel mounting), straight print contacts, Key (C), P series, Multipole Type with 7 Contacts; Manufacturer: LEMO; PartNumber: PKC.M0.7GL.NJ; Number of contacts: 7; Contact Diameter: 0.7 mm; Test voltage (kV rms) Contact-Contact: 1.05; Rated Current(A): 5; DatasheetVersion: Jun-14; PackageReference: PKC.M0.7GL.NJ; PackageDescription: Fixed receptacle with two nuts (back panel mounting), straight print contacts, Key(C) for Printed Circuit; ComponentLink1Description: Manufacturer URL; ComponentLink1URL: http://www.lemo.com; ComponentLink2Description: Datasheet; ComponentLink2URL: http://intra.lemo.ch/catalog/ROW/UK_English/P_series_catalog.pdf
footprint PKC.M0.7GL.NJ (Socket, Female, Height 33.5 mm, Through hole)
pins: 1, 2, 3, 4, 5, 6, 7

## PKC.M0.7GL.NN
designator J?
Fixed receptacle with two nuts (back panel mounting), straight print contacts, Key (C), P series, Multipole Type with 7 Contacts; Manufacturer: LEMO; PartNumber: PKC.M0.7GL.NN; Number of contacts: 7; Contact Diameter: 0.7 mm; Test voltage (kV rms) Contact-Contact: 1.05; Rated Current(A): 5; DatasheetVersion: Jun-14; PackageReference: PKC.M0.7GL.NN; PackageDescription: Fixed receptacle with two nuts (back panel mounting), straight print contacts, Key(C) for Printed Circuit; ComponentLink1Description: Manufacturer URL; ComponentLink1URL: http://www.lemo.com; ComponentLink2Description: Datasheet; ComponentLink2URL: http://intra.lemo.ch/catalog/ROW/UK_English/P_series_catalog.pdf
footprint PKC.M0.7GL.NN (Socket, Female, Height 33.5 mm, Through hole)
pins: 1, 2, 3, 4, 5, 6, 7

## PKC.M0.7GL.NZ
designator J?
Fixed receptacle with 1 nut (without 2nd front nut), Key (C), P series, Multipole Type with 7 Contacts; Manufacturer: LEMO; PartNumber: PKC.M0.7GL.NZ; Number of contacts: 7; Contact Diameter: 0.7 mm; Test voltage (kV rms) Contact-Contact: 1.05; Rated Current(A): 5; DatasheetVersion: Jun-14; PackageReference: PKC.M0.7GL.NZ; PackageDescription: Fixed receptacle with 1 nut (without 2nd front nut), Key(C) for Printed Circuit; ComponentLink1Description: Manufacturer URL; ComponentLink1URL: http://www.lemo.com; ComponentLink2Description: Datasheet; ComponentLink2URL: http://intra.lemo.ch/catalog/ROW/UK_English/P_series_catalog.pdf
footprint PKC.M0.7GL.NZ (Socket, Female, Height 25 mm, Through hole)
pins: 1, 2, 3, 4, 5, 6, 7

## PKC.M0.7GL.VA
designator J?
Fixed receptacle with two nuts (back panel mounting), 90° print contacts, Key (C), P series, Multipole Type with 7 Contacts; Manufacturer: LEMO; PartNumber: PKC.M0.7GL.VA; Number of contacts: 7; Contact Diameter: 0.7 mm; Test voltage (kV rms) Contact-Contact: 1.05; Rated Current(A): 5; DatasheetVersion: Jun-14; PackageReference: PKC.M0.7GL.VA; PackageDescription: Fixed receptacle with two nuts (back panel mounting), 90° print contacts, Key(C) for Printed Circuit; ComponentLink1Description: Manufacturer URL; ComponentLink1URL: http://www.lemo.com; ComponentLink2Description: Datasheet; ComponentLink2URL: http://intra.lemo.ch/catalog/ROW/UK_English/P_series_catalog.pdf
footprint PKC.M0.7GL.VA (Socket, Female, Height 33.5 mm, Through hole)
pins: 1, 2, 3, 4, 5, 6, 7

## PKC.M0.7GL.VR
designator J?
Fixed receptacle with two nuts (back panel mounting), 90° print contacts, Key (C), P series, Multipole Type with 7 Contacts; Manufacturer: LEMO; PartNumber: PKC.M0.7GL.VR; Number of contacts: 7; Contact Diameter: 0.7 mm; Test voltage (kV rms) Contact-Contact: 1.05; Rated Current(A): 5; DatasheetVersion: Jun-14; PackageReference: PKC.M0.7GL.VR; PackageDescription: Fixed receptacle with two nuts (back panel mounting), 90° print contacts, Key(C) for Printed Circuit; ComponentLink1Description: Manufacturer URL; ComponentLink1URL: http://www.lemo.com; ComponentLink2Description: Datasheet; ComponentLink2URL: http://intra.lemo.ch/catalog/ROW/UK_English/P_series_catalog.pdf
footprint PKC.M0.7GL.VR (Socket, Female, Through hole)
pins: 1, 2, 3, 4, 5, 6, 7

## PKC.M0.7GL.VV
designator J?
Fixed receptacle with two nuts (back panel mounting), 90° print contacts, Key (C), P series, Multipole Type with 7 Contacts; Manufacturer: LEMO; PartNumber: PKC.M0.7GL.VV; Number of contacts: 7; Contact Diameter: 0.7 mm; Test voltage (kV rms) Contact-Contact: 1.05; Rated Current(A): 5; DatasheetVersion: Jun-14; PackageReference: PKC.M0.7GL.VV; PackageDescription: Fixed receptacle with two nuts (back panel mounting), 90° print contacts, Key(C) for Printed Circuit; ComponentLink1Description: Manufacturer URL; ComponentLink1URL: http://www.lemo.com; ComponentLink2Description: Datasheet; ComponentLink2URL: http://intra.lemo.ch/catalog/ROW/UK_English/P_series_catalog.pdf
footprint PKC.M0.7GL.VV (Socket, Female, Height 33.5 mm, Through hole)
pins: 1, 2, 3, 4, 5, 6, 7

## PKC.M0.7GL.VZ
designator J?
Fixed receptacle with 1 nut (without 2nd front nut), Key (C), P series, Multipole Type with 7 Contacts; Manufacturer: LEMO; PartNumber: PKC.M0.7GL.VZ; Number of contacts: 7; Contact Diameter: 0.7 mm; Test voltage (kV rms) Contact-Contact: 1.05; Rated Current(A): 5; DatasheetVersion: Jun-14; PackageReference: PKC.M0.7GL.VZ; PackageDescription: Fixed receptacle with 1 nut (without 2nd front nut), Key(C) for Printed Circuit; ComponentLink1Description: Manufacturer URL; ComponentLink1URL: http://www.lemo.com; ComponentLink2Description: Datasheet; ComponentLink2URL: http://intra.lemo.ch/catalog/ROW/UK_English/P_series_catalog.pdf
footprint PKC.M0.7GL.VZ (Socket, Female, Height 33.5 mm, Through hole)
pins: 1, 2, 3, 4, 5, 6, 7

## PKC.M0.7NL.VN
designator J?
Fixed receptacle with two nuts (back panel mounting), 90° print contacts, Key (C), P series, Multipole Type with 7 Contacts; Manufacturer: LEMO; PartNumber: PKC.M0.7NL.VN; Number of contacts: 7; Contact Diameter: 0.7 mm; Test voltage (kV rms) Contact-Contact: 1.05; Rated Current(A): 5; DatasheetVersion: Jun-14; PackageReference: PKC.M0.7NL.VN; PackageDescription: Fixed receptacle with two nuts (back panel mounting), 90° print contacts, Key(C) for Printed Circuit; ComponentLink1Description: Manufacturer URL; ComponentLink1URL: http://www.lemo.com; ComponentLink2Description: Datasheet; ComponentLink2URL: http://intra.lemo.ch/catalog/ROW/UK_English/P_series_catalog.pdf
footprint PKC.M0.7NL.VN (Socket, Female, Height 33.5 mm, Through hole)
pins: 1, 2, 3, 4, 5, 6, 7

## PKC.M0.7SL.NG
designator J?
Fixed receptacle with two nuts (back panel mounting), straight print contacts, Key (C), P series, Multipole Type with 7 Contacts; Manufacturer: LEMO; PartNumber: PKC.M0.7SL.NG; Number of contacts: 7; Contact Diameter: 0.7 mm; Test voltage (kV rms) Contact-Contact: 1.05; Rated Current(A): 5; DatasheetVersion: Jun-14; PackageReference: PKC.M0.7SL.NG; PackageDescription: Fixed receptacle with two nuts (back panel mounting), straight print contacts, Key(C) for Printed Circuit; Supplier 1: Mouser; Supplier Part Number 1: 736-PKCM07SLNG; Supplier 2: Digi-Key; Supplier Part Number 2: PKC.M0.7SL.NG-ND; ComponentLink1Description: Manufacturer URL; ComponentLink1URL: http://www.lemo.com; ComponentLink2Description: Datasheet; ComponentLink2URL: http://intra.lemo.ch/catalog/ROW/UK_English/P_series_catalog.pdf
footprint PKC.M0.7SL.NG (Socket, Female, Height 33.5 mm, Through hole)
pins: 1, 2, 3, 4, 5, 6, 7

## PKC.M0.8GL.NA
designator J?
Fixed receptacle with two nuts (back panel mounting), straight print contacts, Key (C), P series, Multipole Type with 8 Contacts; Manufacturer: LEMO; PartNumber: PKC.M0.8GL.NA; Number of contacts: 8; Contact Diameter: 0.7 mm; Test voltage (kV rms) Contact-Contact: 1.05; Rated Current(A): 5; DatasheetVersion: Jun-14; PackageReference: PKC.M0.8GL.NA; PackageDescription: Fixed receptacle with two nuts (back panel mounting), straight print contacts, Key(C) for Printed Circuit; ComponentLink1Description: Manufacturer URL; ComponentLink1URL: http://www.lemo.com; ComponentLink2Description: Datasheet; ComponentLink2URL: http://intra.lemo.ch/catalog/ROW/UK_English/P_series_catalog.pdf
footprint PKC.M0.8GL.NA (Socket, Female, Height 33.5 mm, Through hole)
pins: 1, 2, 3, 4, 5, 6, 7, 8

## PKC.M0.8GL.NG
designator J?
Fixed receptacle with two nuts (back panel mounting), straight print contacts, Key (C), P series, Multipole Type with 8 Contacts; Manufacturer: LEMO; PartNumber: PKC.M0.8GL.NG; Number of contacts: 8; Contact Diameter: 0.7 mm; Test voltage (kV rms) Contact-Contact: 1.05; Rated Current(A): 5; DatasheetVersion: Jun-14; PackageReference: PKC.M0.8GL.NG; PackageDescription: Fixed receptacle with two nuts (back panel mounting), straight print contacts, Key(C) for Printed Circuit; ComponentLink1Description: Manufacturer URL; ComponentLink1URL: http://www.lemo.com; ComponentLink2Description: Datasheet; ComponentLink2URL: http://intra.lemo.ch/catalog/ROW/UK_English/P_series_catalog.pdf
footprint PKC.M0.8GL.NG (Socket, Female, Height 33.5 mm, Through hole)
pins: 1, 2, 3, 4, 5, 6, 7, 8

## PKC.M0.8GL.NJ
designator J?
Fixed receptacle with two nuts (back panel mounting), straight print contacts, Key (C), P series, Multipole Type with 8 Contacts; Manufacturer: LEMO; PartNumber: PKC.M0.8GL.NJ; Number of contacts: 8; Contact Diameter: 0.7 mm; Test voltage (kV rms) Contact-Contact: 1.05; Rated Current(A): 5; DatasheetVersion: Jun-14; PackageReference: PKC.M0.8GL.NJ; PackageDescription: Fixed receptacle with two nuts (back panel mounting), straight print contacts, Key(C) for Printed Circuit; ComponentLink1Description: Manufacturer URL; ComponentLink1URL: http://www.lemo.com; ComponentLink2Description: Datasheet; ComponentLink2URL: http://intra.lemo.ch/catalog/ROW/UK_English/P_series_catalog.pdf
footprint PKC.M0.8GL.NJ (Socket, Female, Height 33.5 mm, Through hole)
pins: 1, 2, 3, 4, 5, 6, 7, 8

## PKC.M0.8GL.NN
designator J?
Fixed receptacle with two nuts (back panel mounting), straight print contacts, Key (C), P series, Multipole Type with 8 Contacts; Manufacturer: LEMO; PartNumber: PKC.M0.8GL.NN; Number of contacts: 8; Contact Diameter: 0.7 mm; Test voltage (kV rms) Contact-Contact: 1.05; Rated Current(A): 5; DatasheetVersion: Jun-14; PackageReference: PKC.M0.8GL.NN; PackageDescription: Fixed receptacle with two nuts (back panel mounting), straight print contacts, Key(C) for Printed Circuit; Supplier 1: Mouser; Supplier Part Number 1: 736-PKC.M0.8GL.NN; Supplier 2: Digi-Key; Supplier Part Number 2: PKC.M0.8GL.NN-ND; ComponentLink1Description: Manufacturer URL; ComponentLink1URL: http://www.lemo.com; ComponentLink2Description: Datasheet; ComponentLink2URL: http://intra.lemo.ch/catalog/ROW/UK_English/P_series_catalog.pdf
footprint PKC.M0.8GL.NN (Socket, Female, Height 33.5 mm, Through hole)
pins: 1, 2, 3, 4, 5, 6, 7, 8
